# Altium footprint library mobinbyn-IC.PcbLib: 41 footprints (part 1 of 3)
Each footprint in its own frame and in the unit in brackets; x right, y up, seen from the top. Pads: shape width x height; smd on the part's side, far side on the other; paste and mask are expansions set on the pad; w line width, h text height; cw(c..) or ccw(c..) is an arc to the next point about the centre after c.
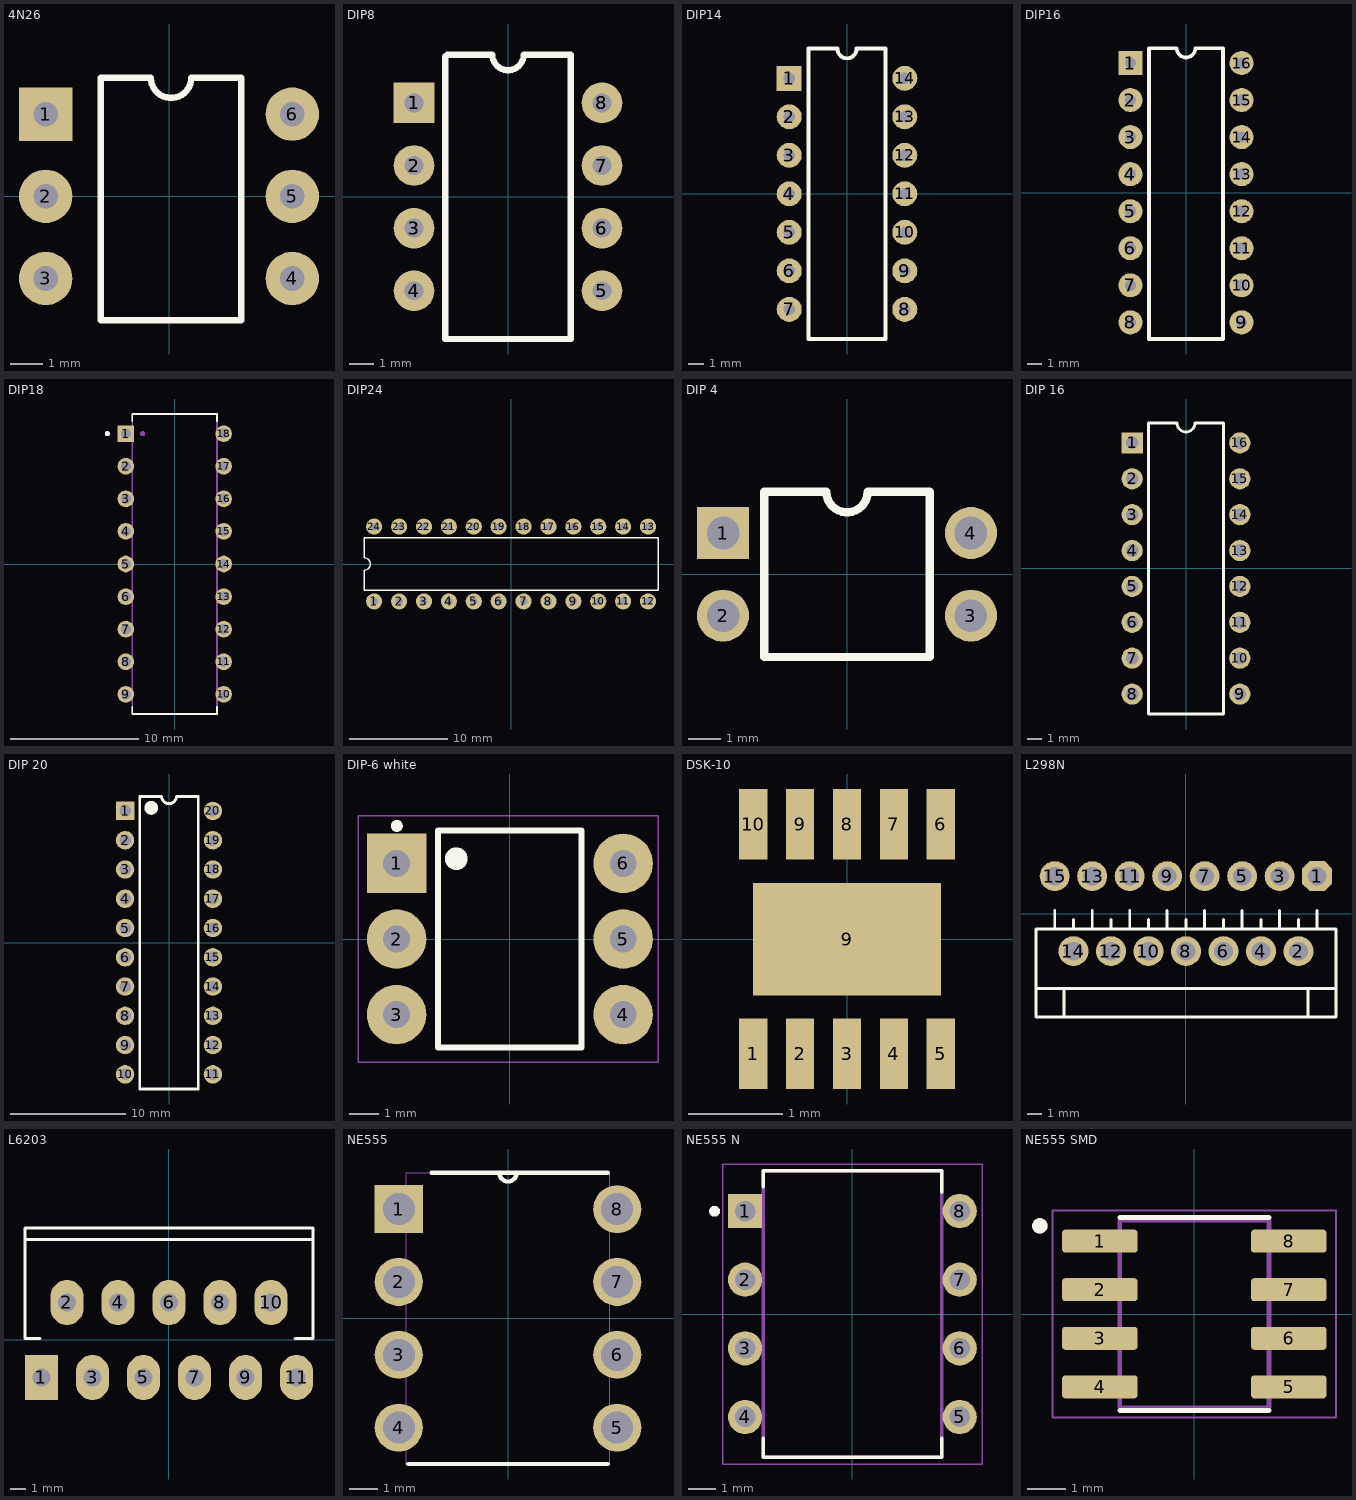
[diagram p0: the footprints below, top view; thin cyan lines are the x and y axes]

## 4N26 [mil]
pads (6):
  rect 65x65 hole 30: 1(-150,100)
  round 65 hole 30: 2(-150,0) 3(-150,-100) 4(150,-100) 5(150,0) 6(150,100)
Top Overlay:
  lines w7.87: -82.76,-151.06 -82.76,144.21 -22.13,144.21 ccw(c2.48,144.21) 27.09,144.21 87.72,144.21 87.72,-151.06 -82.76,-151.06
3D body "User Library-DIP6-White.STEP": height 78.74, standoff -208.66, extent -154.92,-140.15 154.92,140.16

## DIP8 [mil]
pads (16):
  rect 65x65 hole 30: 1(-150,150) 1(-150,150)
  round 65 hole 30: 2(-150,50) 2(-150,50) 3(-150,-50) 3(-150,-50) 4(-150,-150) 4(-150,-150) 5(150,-150) 5(150,-150) 6(150,-50) 6(150,-50) 7(150,50) 7(150,50) 8(150,150) 8(150,150)
Top Overlay:
  lines w10: -100,-227 -100,224 -97,227 -25,227 ; -100,-227 100,-227 ; -100,-227 100,-227 ; -25,227 ccw(c0,227) 25,227 ; -25,227 ccw(c0,227) 25,227 ; 25,227 100,227 100,207 100,-227
3D body "SW3DPS-DIP8-DEFAULT.step": height 165, standoff -105, extent -155,-225 155,225
3D body "SW3DPS-DIP8-DEFAULT.step": height 165, standoff -105, extent -155,-225 155,225

## DIP14 [mil]
pads (14):
  rect 65x65 hole 30: 1(-150,300)
  round 65 hole 30: 2(-150,200) 3(-150,100) 4(-150,0) 5(-150,-100) 6(-150,-200) 7(-150,-300) 8(150,-300) 9(150,-200) 10(150,-100) 11(150,0) 12(150,100) 13(150,200) 14(150,300)
Top Overlay:
  lines w10: -100,-377 -100,377 -25,377 ccw(c0,377) 25,377 100,377 100,-377 -100,-377
3D body "SW3dPS-DIP14-300.step": height 200, standoff -98.03, extent -154.92,-383.86 154.92,383.86

## DIP16 [mil]
pads (16):
  rect 65x65 hole 30: 1(-150,350)
  round 65 hole 30: 2(-150,250) 3(-150,150) 4(-150,50) 5(-150,-50) 6(-150,-150) 7(-150,-250) 8(-150,-350) 9(150,-350) 10(150,-250) 11(150,-150) 12(150,-50) 13(150,50) 14(150,150) 15(150,250) 16(150,350)
Top Overlay:
  lines w10: -100,-395 100,-395 100,390 25,390 cw(c0,390) -25,390 -100,390 -100,-395
3D body "SW3dPS-DIP16-300.step": height 200, standoff -98.03, extent -154.92,-393.7 154.93,393.7

## DIP18 [mm]
pads (18):
  rect 1.298x1.298 hole 0.79: 1(-3.81,10.16)
  round 1.298 hole 0.79: 2(-3.81,7.62) 3(-3.81,5.08) 4(-3.81,2.54) 5(-3.81,0) 6(-3.81,-2.54) 7(-3.81,-5.08) 8(-3.81,-7.62) 9(-3.81,-10.16) 10(3.81,-10.16) 11(3.81,-7.62) 12(3.81,-5.08) 13(3.81,-2.54) 14(3.81,0) 15(3.81,2.54) 16(3.81,5.08) 17(3.81,7.62) 18(3.81,10.16)
Top Overlay:
  circle w0.2: c-5.25,10.16 r0.1
  lines w0.127: -3.3,-11.14 -3.3,-11.69 3.3,-11.69 3.3,-11.14 ; -3.3,11.14 -3.3,11.69 3.3,11.69 3.3,11.14
Mechanical 13:
  circle w0.2: c-2.5,10.16 r0.1
  lines w0.127: -3.3,-11.69 -3.3,11.69 3.3,11.69 3.3,-11.69 -3.3,-11.69
3D body "DIP18.step": height 5, standoff -3, extent -3.935,-11 3.935,11

## DIP24 [mil]
pads (24):
  round 65 hole 30: 1(-550,-150) 2(-450,-150) 3(-350,-150) 4(-250,-150) 5(-150,-150) 6(-50,-150) 7(50,-150) 8(150,-150) 9(250,-150) 10(350,-150) 11(450,-150) 12(550,-150) 13(550,150) 14(450,150) 15(350,150) 16(250,150) 17(150,150) 18(50,150) 19(-50,150) 20(-150,150) 21(-250,150) 22(-350,150) 23(-450,150) 24(-550,150)
Top Overlay:
  lines w6: -590,-105 -590,-25 ccw(c-590,0) -590,25 -590,105 590,105 590,-105 -590,-105
3D body "DIP24.step": height 171.65, standoff -118.11, extent -584.65,-154.92 584.65,154.92

## DIP 4 [mm]
height 1.2
pads (4):
  rect 1.6x1.6 hole 1: 1(-3.81,1.27)
  round 1.6 hole 1: 2(-3.81,-1.27) 3(3.81,-1.27) 4(3.81,1.27)
Top Overlay:
  lines w0.254: -2.54,-2.54 2.54,-2.54 2.54,2.54 0.635,2.54 cw(c0,2.54) -0.635,2.54 -2.54,2.54 -2.54,-2.54
3D body "User Library-DIP-4.SLDPRT": height 4.3, standoff -3, extent -3.935,-2.28 3.935,2.3

## DIP 16 [mm] "DIP; 16 Leads; Row Spacing 7.62 mm; Pitch 2.54 mm"
height 5.1
pads (16):
  rect 1.5x1.5 hole 0.9: 1(-3.81,8.89)
  round 1.5 hole 0.9: 2(-3.81,6.35) 3(-3.81,3.81) 4(-3.81,1.27) 5(-3.81,-1.27) 6(-3.81,-3.81) 7(-3.81,-6.35) 8(-3.81,-8.89) 9(3.81,-8.89) 10(3.81,-6.35) 11(3.81,-3.81) 12(3.81,-1.27) 13(3.81,1.27) 14(3.81,3.81) 15(3.81,6.35) 16(3.81,8.89)
Top Overlay:
  lines w0.2: -2.65,-10.3 -2.65,10.3 -0.635,10.3 ccw(c0,10.3) 0.635,10.3 2.65,10.3 2.65,-10.3 -2.65,-10.3
3D body "SW3dPS-DIP16-300.step": height 5.08, standoff -2.49, extent -3.935,-10 3.935,10

## DIP 20 [mm]
height 2.8
pads (20):
  rect 1.6x1.6 hole 1: 1(-3.81,11.43)
  round 1.6 hole 1: 2(-3.81,8.89) 3(-3.81,6.35) 4(-3.81,3.81) 5(-3.81,1.27) 6(-3.81,-1.27) 7(-3.81,-3.81) 8(-3.81,-6.35) 9(-3.81,-8.89) 10(-3.81,-11.43) 11(3.81,-11.43) 12(3.81,-8.89) 13(3.81,-6.35) 14(3.81,-3.81) 15(3.81,-1.27) 16(3.81,1.27) 17(3.81,3.81) 18(3.81,6.35) 19(3.81,8.89) 20(3.81,11.43)
Top Overlay:
  circle w0.6: c-1.54,11.7 r0.3
  lines w0.254: -2.54,-12.7 2.54,-12.7 2.54,12.7 0.635,12.7 cw(c0,12.7) -0.635,12.7 -2.54,12.7 -2.54,-12.7
3D body "User Library-DIP20.STEP": height 4.57, standoff -3.81, extent -3.91,-13.27 3.91,13.27

## DIP-6 white [mm]
pads (6):
  rect 2x2 hole 0.9: 1(-3.81,2.54)
  round 2 hole 0.9: 2(-3.81,0) 3(-3.81,-2.54) 4(3.81,-2.54) 5(3.81,0) 6(3.81,2.54)
Top Overlay:
  circle w0.2: c-1.8,2.7 r0.283
  circle w0.2: c-3.8,3.8 r0.1
  lines w0.2: -1.8,2.7 -2,2.6 ; -2,2.6 -1.8,2.9 -1.6,2.7 -1.7,2.5 -2,2.6 ; -2.413,-3.65 2.413,-3.65 2.413,3.65 -2.413,3.65 -2.413,-3.65
Mechanical 15:
  lines w0.05: -5.105,-4.15 4.978,-4.15 4.978,4.15 -5.105,4.15 -5.105,-4.15
3D body "User Library-DIP6-White.STEP": height 2, standoff -5.3, extent -3.935,-3.56 3.935,3.56

## DSK-10 [mm]
pads (11):
  rect 0.3x0.75 smd: 1(-1,-1.225) 2(-0.5,-1.225) 3(0,-1.225) 4(0.5,-1.225) 5(1,-1.225) 6(1,1.225) 7(0.5,1.225) 8(0,1.225) 9(-0.5,1.225) 10(-1,1.225)
  rect 2x1.2 smd: 9(0,0)
3D body "User Library-DSK-10.step": height 0.85, standoff 0, extent -1.295,-1.356 1.305,1.344

## L298N [mil]
pads (15):
  oct 80x80 hole 50: 1(350,100)
  round 80 hole 50: 2(300,-100) 3(250,100) 4(200,-100) 5(150,100) 6(100,-100) 7(50,100) 8(0,-100) 9(-50,100) 10(-100,-100) 11(-150,100) 12(-200,-100) 13(-250,100) 14(-300,-100) 15(-350,100)
Top Overlay:
  lines w7.87: -350,-40.91 -350,9.09 ; -325,-275 -325,-200 ; -300,-40.91 -300,-15.91 ; -250,-40.91 -250,9.09 ; -200,-40.91 -200,-15.91 ; -150,-40.91 -150,9.09 ; -100,-40.91 -100,-15.91 ; -50,-40.91 -50,9.09 ; 0,-40.91 0,-15.91 ; 50,-40.91 50,9.09 ; 100,-40.91 100,-15.91 ; 150,-40.91 150,9.09 ; 200,-40.91 200,-15.91 ; 250,-40.91 250,9.09 ; 300,-40.91 300,-15.91 ; 325,-275 325,-200 ; 350,-40.91 350,9.09 ; 400,-200 -400,-200 ; 400,-40.91 -400,-40.91 -400,-200 ; 400.16,-40.91 400,-183.33 400,-275 -400,-275 -400,-200
3D body "User Library-Multiwatt15V.SLDPRT": height 838.58, standoff -39.37, extent -385.83,-275 385.83,114.37

## L6203 [mm]
height 10.95
pads (11):
  rect 2.2x3 hole 1.2: 1(-8.5,-2.5)
  oval 2.2x3 hole 1.2: 2(-6.8,2.5) 3(-5.1,-2.5) 4(-3.4,2.5) 5(-1.7,-2.5) 6(0,2.5) 7(1.7,-2.5) 8(3.4,2.5) 9(5.1,-2.5) 10(6.8,2.5) 11(8.5,-2.5)
Top Overlay:
  lines w0.2: -9.56,6.69 9.6,6.69 ; -8.6,0.1 -9.6,0.1 -9.6,7.466 9.6,7.466 9.6,0.1 8.4,0.1
3D body "User Library-Multiwatt11V.STEP": height 21.8, standoff -3.2, extent -10.1,-3 10.1,6.89

## NE555 [mil]
pads (8):
  rect 66x66 hole 44: 1(-150,150)
  round 66 hole 44: 2(-150,50) 3(-150,-50) 4(-150,-150) 5(150,-150) 6(150,-50) 7(150,50) 8(150,150)
Top Overlay:
  lines w6: -137,-200 137,-200 ; -105,200 -12,200 ; 137,200 12,200 ; -12,200 ccw(c0,200) 12,200 ; -12,200 12,200
Mechanical 1:
  lines w0: -12,200 ccw(c0,200) 12,200 ; -12,200 12,200 ; -12,200 -140,200 -140,-200 140,-200 140,200 12,200 ; -172,-172 -172,-128 -140,-128 -140,-172 -172,-172 ; -172,-72 -172,-28 -140,-28 -140,-72 -172,-72 ; -172,28 -172,72 -140,72 -140,28 -172,28 ; -172,128 -172,172 -140,172 -140,128 -172,128 ; 140,-172 140,-128 172,-128 172,-172 140,-172 ; 140,-72 140,-28 172,-28 172,-72 140,-72 ; 140,28 140,72 172,72 172,28 140,28 ; 140,128 140,172 172,172 172,128 140,128
3D body "CircuitWorks-DIP8.step": height 165, standoff -105, extent -150,-225 160,225

## NE555 N [mm]
pads (8):
  rect 1.268x1.268 hole 0.76: 1(-3.97,3.81)
  round 1.268 hole 0.76: 2(-3.97,1.27) 3(-3.97,-1.27) 4(-3.97,-3.81) 5(3.97,-3.81) 6(3.97,-1.27) 7(3.97,1.27) 8(3.97,3.81)
Top Overlay:
  circle w0.2: c-5.1,3.8 r0.1
  lines w0.127: -3.3,-4.6 -3.3,-5.3 3.3,-5.3 3.3,-4.6 ; -3.3,4.7 -3.3,5.3 3.3,5.3 3.3,4.5
Mechanical 13:
  lines w0.127: -3.3,-5.3 3.3,-5.3 3.3,5.3 -3.3,5.3 -3.3,-5.3
Mechanical 15:
  lines w0.05: -4.8,-5.55 4.8,-5.55 4.8,5.55 -4.8,5.55 -4.8,-5.55
3D body "CircuitWorks-DIP8.step": height 4.19, standoff -2.67, extent -3.937,-5.715 3.937,5.715

## NE555 SMD [mm]
pads (8):
  rrect25% 1.97x0.6 smd: 1(-2.47,1.905) 2(-2.47,0.635) 3(-2.47,-0.635) 4(-2.47,-1.905) 5(2.47,-1.905) 6(2.47,-0.635) 7(2.47,0.635) 8(2.47,1.905)
Top Overlay:
  circle w0.2: c-4.04,2.305 r0.1
  lines w0.127: -1.95,-2.525 1.95,-2.525 ; -1.95,2.525 1.95,2.525
Mechanical 13:
  circle w0.2: c-4.04,2.305 r0.1
  lines w0.127: -1.95,-2.452 -1.95,2.452 1.95,2.452 1.95,-2.452 -1.95,-2.452
Mechanical 15:
  lines w0.05: -3.705,-2.702 -3.705,2.702 3.705,2.702 3.705,-2.702 -3.705,-2.702
3D body "SOIC 8.step": height 1.73, standoff -0.02, extent -3.175,-2.526 2.94,2.474